# Altium footprint library Toi Library.PcbLib: 740 footprints (part 20 of 47)
Each footprint in its own frame and in the unit in brackets; x right, y up, seen from the top. Pads: shape width x height; smd on the part's side, far side on the other; paste and mask are expansions set on the pad; w line width, h text height; cw(c..) or ccw(c..) is an arc to the next point about the centre after c.
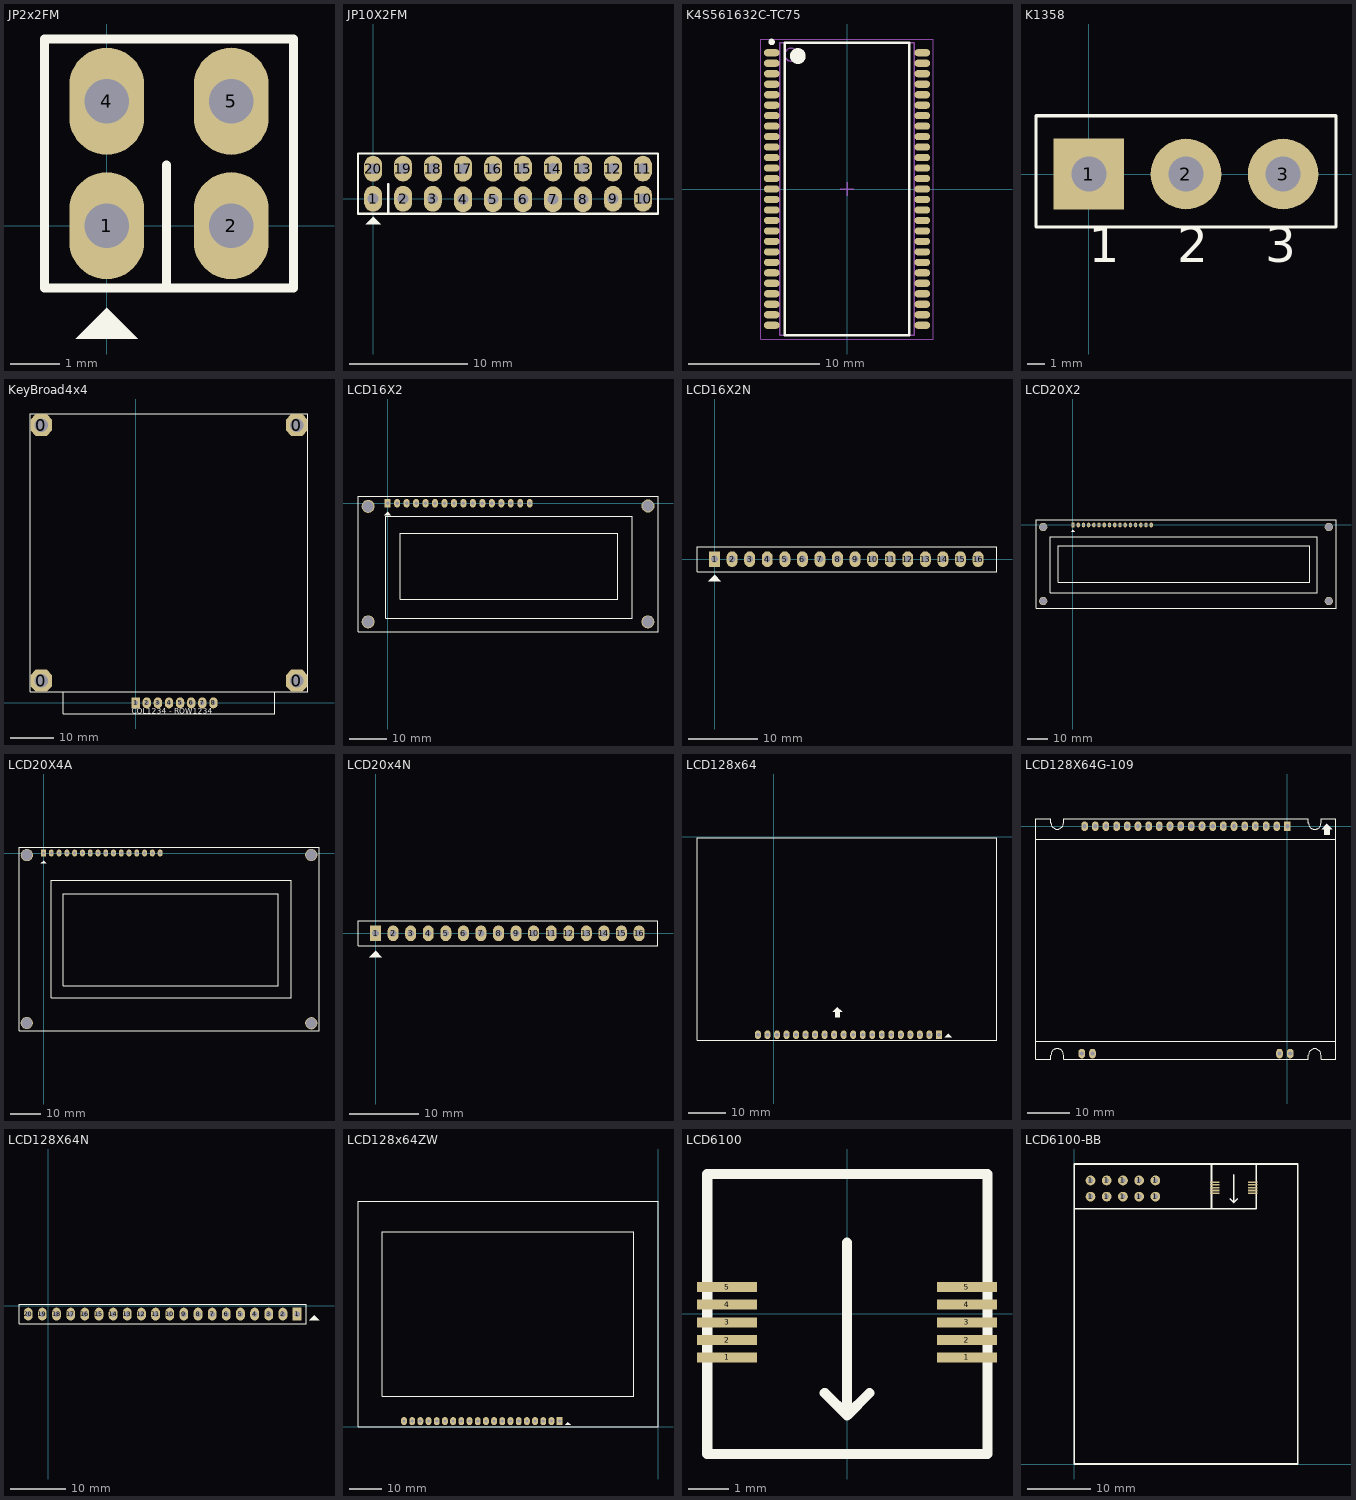
[diagram p19: the footprints below, top view; thin cyan lines are the x and y axes]

## JP2x2FM [mil]
pads (4):
  oval 60x86 hole 36: 1(0,0) 2(100,0) 4(0,100) 5(100,100)
Top Overlay:
  region: 0,-66 -25,-91 25,-91
  lines w7: 48,-50 48,49 ; -50,-50 150,-50 150,150 -50,150 -50,50 -50,-50
3D body "4 cong.stp": height 335.25, standoff -125.38, extent -54.92,-48.43 154.92,148.43

## JP10X2FM [mil]
pads (20):
  oval 60x86 hole 36: 1(0,0) 2(100,0) 3(199,0) 4(300,-2) 5(400,-2) 6(500,-2) 7(600,-2) 8(700,-2) 9(800,0) 10(900,0) 11(899.5,100.5) 12(799.5,100.5) 13(699.5,100.5) 14(599.5,100.5) 15(499.5,100.5) 16(400,100) 17(300,100) 18(199.5,100.5) 19(99.5,100.5) 20(0,100)
Top Overlay:
  region: 0.5,-60.5 -24.5,-85.5 25.5,-85.5
  lines w7: -50.5,150.5 949.5,150.5 ; -50,150 -50,50 -50,-50 950,-50 950,150 ; 50.5,-49.5 50.5,48.5
3D body "cai 20.stp": height 335.25, standoff -125.38, extent -54.92,-48.43 954.92,148.43

## K4S561632C-TC75 [mm] "TSOP, 54-Leads, Body 22.22x10.16mm, Pitch 0.80mm, IPC Medium Density"
height 1.2
pads (54):
  oval 1.2x0.55 smd: 1(-5.75,10.4) 2(-5.75,9.6) 3(-5.75,8.8) 4(-5.75,8) 5(-5.75,7.2) 6(-5.75,6.4) 7(-5.75,5.6) 8(-5.75,4.8) 9(-5.75,4) 10(-5.75,3.2) 11(-5.75,2.4) 12(-5.75,1.6) 13(-5.75,0.8) 14(-5.75,0) 15(-5.75,-0.8) 16(-5.75,-1.6) 17(-5.75,-2.4) 18(-5.75,-3.2) 19(-5.75,-4) 20(-5.75,-4.8) 21(-5.75,-5.6) 22(-5.75,-6.4) 23(-5.75,-7.2) 24(-5.75,-8) 25(-5.75,-8.8) 26(-5.75,-9.6) 27(-5.75,-10.4) 28(5.75,-10.4) 29(5.75,-9.6) 30(5.75,-8.8) 31(5.75,-8) 32(5.75,-7.2) 33(5.75,-6.4) 34(5.75,-5.6) 35(5.75,-4.8) 36(5.75,-4) 37(5.75,-3.2) 38(5.75,-2.4) 39(5.75,-1.6) 40(5.75,-0.8) 41(5.75,0) 42(5.75,0.8) 43(5.75,1.6) 44(5.75,2.4) 45(5.75,3.2) 46(5.75,4) 47(5.75,4.8) 48(5.75,5.6) 49(5.75,6.4) 50(5.75,7.2) 51(5.75,8) 52(5.75,8.8) 53(5.75,9.6) 54(5.75,10.4)
Top Overlay:
  circle w0.25: c-5.75,11.225 r0.125
  circle w0.6: c-3.75,10.15 r0.3
  lines w0.2: -4.75,-11.15 -4.75,11.15 4.75,11.15 4.75,-11.15 -4.75,-11.15
Mechanical 13:
  circle w0.1: c-4.25,10.25 r0.5
  lines w0.1: -5.15,-11.15 -5.15,11.15 5.15,11.15 5.15,-11.15 -5.15,-11.15
Mechanical 15:
  lines w0.05: -6.6,-11.45 -6.6,11.45 6.6,11.45 6.6,-11.45 -6.6,-11.45
  lines w0.1: -0.5,0 0.5,0 ; 0,-0.5 0,0.5
3D body: height 1.2, standoff 0, extent -5.88,-11.15 5.88,11.15

## K1358 [mm] "TO-220 - 1-2-3"
height 5.08
pads (3):
  rect 4x4 hole 2: 1(0,0)
  round 4 hole 2: 2(5.5,0) 3(11,0)
Top Overlay:
  lines w0.178: -3,-3 14,-3 14,3.302 -3,3.302 -3,-1.445 -3,-3
  text "1" at 0,-5 h2
  text "2" at 5,-5 h2
  text "3" at 10,-5 h2

## KeyBroad4x4 [mm] "KeyBroad 4x4"
height 5.08
pads (12):
  oct 5x5 hole 3.048: 0(-21.59,5.08) 0(-21.59,63.5) 0(36.83,5.08) 0(36.83,63.5)
  rect 1.905x2.5 hole 1: 1(0,0)
  oval 1.905x2.5 hole 1: 2(2.54,0) 3(5.08,0) 4(7.62,0) 5(10.16,0) 6(12.7,0) 7(15.24,0) 8(17.78,0)
Top Overlay:
  lines w0.203: -16.51,2.54 -16.51,-2.515 -16.535,-2.54 31.75,-2.54 31.75,2.489 ; -24.13,2.54 39.37,2.54 39.37,66.04 -24.13,66.04 -24.13,2.54
  text "COL1234 - ROW1234" at -0.889,-2.464 h1.27

## LCD16X2 [mil] "LCD dipslay 16x2, 16 pin"
height 400
pads (20):
  rect 62x90 hole 36: 1(0,0)
  oval 62x90 hole 36: 2(100,0) 3(200,0) 4(300,0) 5(400,0) 6(500,0) 7(600,0) 8(700,0) 9(800,0) 10(900,0) 11(1000,0) 12(1100,0) 13(1200,0) 14(1300,0) 15(1400,0) 16(1500,0)
  round 137.8 hole 118.11: "Hole 0"(-206,-1252) "Hole 0"(-206,-33) "Hole 0"(2747,-1252) "Hole 0"(2748,-29)
Top Overlay:
  region: 0,-90 -35,-125 35,-125
  lines w7: -313,-1359 2854,-1359 2854,76 -313,76 -313,-1359 ; -19,-1215 2581,-1215 2581,-140 -19,-140 -19,-1215 ; 131,-1015 2431,-1015 2431,-315 131,-315 131,-1015
3D body "LCD module 16 X 2 backlight.STEP": height 728.96, standoff 208.96, extent -314.65,-1360 2854.65,77.01
3D body "female_header_a-bl254-eg-g16d.stp": height 440.94, standoff -19.69, extent -56.12,-45.03 1553.72,53.4

## LCD16X2N [mil] "LCD dipslay 16x2, 16 pin"
height 400
pads (16):
  rect 62x90 hole 39: 1(0,0)
  oval 62x90 hole 39: 2(100,0) 3(200,0) 4(300,0) 5(400,0) 6(500,0) 7(600,0) 8(700,0) 9(800,0) 10(900,0) 11(1000,0) 12(1100,0) 13(1200,0) 14(1300,0) 15(1400,0) 16(1500,0)
Top Overlay:
  region: 0,-90 -35,-125 35,-125
  lines w7: -100,-71 1608,-71 1608,70 -100,70 -100,-71
3D body "lcd16.STEP": height 764, standoff 244, extent -319.64,-1353.49 2849.65,83.51
3D body "jp16.stp": height 468.11, standoff -20.08, extent -48.03,-48.43 1548.03,50
3D body "socket16.stp": height 276.19, standoff -117.51, extent -49,-49 1551,51

## LCD20X2 [mil] "LCD dipslay 20x2, 16 pin"
height 400
pads (20):
  rect 62x90 hole 36: 1(0,0)
  oval 62x90 hole 36: 2(100,0) 3(200,0) 4(300,0) 5(400,0) 6(500,0) 7(600,0) 8(700,0) 9(800,0) 10(900,0) 11(1000,0) 12(1100,0) 13(1200,0) 14(1300,0) 15(1400,0) 16(1500,0)
  round 157.48 hole 137.8: "Hole 0"(-570.87,-1456.69) "Hole 0"(-570.87,-39.37) "Hole 0"(4901.57,-1456.69) "Hole 0"(4901.57,-39.37)
Top Overlay:
  region: 0,-90 -35,-125 35,-125
  lines w7: -708.66,-1594.49 -708.66,100 5039.37,100 5039.37,-1594.49 -708.66,-1594.49 ; -436,-1300 -436,-225 4682,-225 4682,-1300 -436,-1300 ; -286,-1100 -286,-400 4532,-400 4532,-1100 -286,-1100
3D body "SW3dPS-Display20x2.STEP": height 198, standoff -180, extent -100,-1437 4470,33

## LCD20X4A [mil] "LCD dipslay 20x4, 16 pin"
height 400
pads (20):
  rect 62x90 hole 39: 1(0,0)
  oval 62x90 hole 39: 2(100,0) 3(200,0) 4(300,0) 5(400,0) 6(500,0) 7(600,0) 8(700,0) 9(800,0) 10(900,0) 11(1000,0) 12(1100,0) 13(1200,0) 14(1300,0) 15(1400,0) 16(1500,0)
  round 157.48 hole 137.8: "Hole 0"(-216,-2188) "Hole 0"(-215,-27) "Hole 0"(3445,-2190) "Hole 0"(3445,-25)
Top Overlay:
  region: 0,-100 -35,-135 35,-135
  lines w7: -316,-2287 -316,74 3544,74 3544,-2287 -316,-2287 ; 102,-1863 102,-348 3189,-348 3189,-1863 102,-1863 ; 252,-1706 252,-523 3018,-523 3018,-1706 252,-1706
3D body "User Library-Sparkfun20x4LCD-1.STEP": height 413.39, standoff 0, extent -314.27,-2288.21 3544,74

## LCD20x4N [mil] "LCD dipslay 20x4, 16 pin"
height 400
pads (16):
  rect 62x90 hole 39: 1(0,0)
  oval 62x90 hole 39: 2(100,0) 3(200,0) 4(300,0) 5(400,0) 6(500,0) 7(600,0) 8(700,0) 9(800,0) 10(900,0) 11(1000,0) 12(1100,0) 13(1200,0) 14(1300,0) 15(1400,0) 16(1500,0)
Top Overlay:
  region: 0,-100 -35,-135 35,-135
  lines w7: -100,-71 1608,-71 1608,70 -100,70 -100,-71
3D body "User Library-LCD20_4.STEP": height 417.32, standoff -125.98, extent -392,-2265.2 3466.27,97

## LCD128x64 [mil] "LCD Graphic 128x64, 20 pin"
height 400
pads (20):
  rect 62x90 hole 39: 1(1735,-2080)
  oval 62x90 hole 39: 2(1635,-2080) 3(1535,-2080) 4(1435,-2080) 5(1335,-2080) 6(1235,-2080) 7(1135,-2080) 8(1035,-2080) 9(935,-2080) 10(835,-2080) 11(735,-2080) 12(635,-2080) 13(535,-2080) 14(435,-2080) 15(335,-2080) 16(235,-2080) 17(135,-2080) 18(35,-2080) 19(-65,-2080) 20(-165,-2080)
Top Overlay:
  region: 1832.5,-2072.5 1797.5,-2107.5 1867.5,-2107.5
  region: 670,-1790 620,-1840 645,-1840 645,-1895 695,-1895 695,-1840 720,-1840
  lines w8: -805,-2138 -805,-12 2345,-12 2345,-2138 -805,-2138
3D body "User Library-GRAPHIC LCD WG12864B.STEP": height 275.59, standoff -330.71, extent -804.61,-2137.98 2345,-12

## LCD128X64G-109 [mil] "LCD Graphic 128x64, 20 pin"
height 400
pads (24):
  oval 62x90 hole 39.37: 0(-1925.87,-2129.13) 0(-1825.87,-2129.13) 0(-74.13,-2129.13) 0(25.87,-2129.13) 2(-100,0) 3(-200,0) 4(-300,0) 5(-400,0) 6(-500,0) 7(-600,0) 8(-700,0) 9(-800,0) 10(-900,0) 11(-1000,0) 12(-1100,0) 13(-1200,0) 14(-1300,0) 15(-1400,0) 16(-1500,0) 17(-1600,0) 18(-1700,0) 19(-1800,0) 20(-1900,0)
  rect 62x90 hole 39.37: 1(0,0)
Top Overlay:
  region: 370,23.37 320,-26.63 345,-26.63 345,-81.63 395,-81.63 395,-26.63 420,-26.63
  lines w8: -2355,-2014.13 450,-2014.13 ; -2355,-124.13 450,-124.13 ; -2215,-2184.13 -2355,-2184.13 -2355,70.87 -2215,70.87 ; -2215,-2183.13 -2215,-2143.13 cw(c-2155.94,-2143.13) -2096.89,-2143.13 ; -2215,29.87 -2215,69.87 ; -2215,31.87 ccw(c-2155.94,31.87) -2096.89,31.87 ; -2097,-2143.13 -2097,-2183.13 -2095,-2183.13 ; -2097,29.87 -2097,69.87 -2095,69.87 ; -2095,-2184.13 195,-2184.13 197,-2184.13 197,-2144.13 ; -2095,70.87 195,70.87 ; 195,68.87 197,68.87 197,28.87 ; 196.89,-2144.13 cw(c255.94,-2144.13) 315,-2144.13 315,-2184.13 455,-2184.13 455,70.87 315,70.87 ; 196.89,30.87 ccw(c255.94,30.87) 315,30.87 ; 315,28.87 315,68.87
3D body: height 98.43, standoff 39.37, extent -2355,-2185 455,70
3D body: height 196.85, standoff 98.43, extent -2350,-2015 450,-125

## LCD128X64N [mil] "LCD Graphic 128x64, 20 pin"
height 400
pads (20):
  rect 62x90 hole 39: 1(1760,-60)
  oval 62x90 hole 39: 2(1660,-60) 3(1560,-60) 4(1460,-60) 5(1360,-60) 6(1260,-60) 7(1160,-60) 8(1060,-60) 9(960,-60) 10(860,-60) 11(760,-60) 12(660,-60) 13(560,-60) 14(460,-60) 15(360,-60) 16(260,-60) 17(160,-60) 18(60,-60) 19(-40,-60) 20(-140,-60)
Top Overlay:
  region: 1880,-70 1845,-105 1915,-105
  lines w7: -205,-130 -205,11 1825,11 1825,-130 -205,-130

## LCD128x64ZW [mm] "LCD Graphic 128x64, 20 pin"
height 10.16
pads (20):
  rect 1.8x2.5 hole 1: 1(-30.505,1.803)
  oval 1.8x2.5 hole 1: 2(-33.045,1.803) 3(-35.585,1.803) 4(-38.125,1.803) 5(-40.665,1.803) 6(-43.205,1.803) 7(-45.745,1.803) 8(-48.285,1.803) 9(-50.825,1.803) 10(-53.365,1.803) 11(-55.905,1.803) 12(-58.445,1.803) 13(-60.985,1.803) 14(-63.525,1.803) 15(-66.065,1.803) 16(-68.605,1.803) 17(-71.145,1.803) 18(-73.685,1.803) 19(-76.225,1.803) 20(-78.765,1.803)
Top Overlay:
  region: -27.953,1.486 -28.842,0.597 -27.064,0.597
  lines w0.203: -93.015,0 -93.015,70 -0.015,70 -0.015,0 -93.015,0 ; -85.522,9.5 -7.518,9.5 -7.518,60.503 -85.522,60.503 -85.522,9.5
3D body "User Library-GRAPHIC LCD WG12864B.STEP": height 7, standoff -8.4, extent -86.502,7.95 -6.502,61.95

## LCD6100 [mm]
pads (10):
  rect 1.5x0.25 smd: 1(-3,-1.091) 1(2.994,-1.091) 2(-3,-0.66) 2(2.994,-0.66) 3(-3,-0.215) 3(2.994,-0.215) 4(-3,0.229) 4(2.994,0.229) 5(-3,0.661) 5(2.994,0.661)
Top Overlay:
  lines w0.254: -0.559,-1.981 0,-2.54 ; 0,1.778 0,-2.54 ; 0.559,-1.981 0,-2.54 ; -3.493,-3.507 3.507,-3.507 3.507,3.493 -3.493,3.493 -3.493,-3.507

## LCD6100-BB [mil]
pads (20):
  round 60 hole 30: 1(100,1649) 1(100,1749) 1(200,1649) 1(200,1749) 1(300,1649) 1(300,1749) 1(400,1649) 1(400,1749) 1(500,1649) 1(500,1749)
  rect 59.06x9.84 smd: 1(865.83,1669.92) 1(1101.83,1669.92) 2(865.83,1686.92) 2(1101.83,1686.92) 3(865.83,1704.42) 3(1101.83,1704.42) 4(865.83,1721.92) 4(1101.83,1721.92) 5(865.83,1738.92) 5(1101.83,1738.92)
Top Overlay:
  lines w10: 0,0 1377.95,0 1377.95,1849.39 ; 0,1 0,1850.39 1377.95,1850.39 ; 0,1574.8 1122.05,1574.8 ; 961.96,1634.89 983.96,1612.89 ; 983.96,1782.89 983.96,1612.89 ; 1005.96,1634.89 983.96,1612.89 ; 1122.05,1574.8 1122.05,1850.39 846.46,1850.39 846.46,1574.8 1122.05,1574.8